# Altium integrated library AKN_PI_Library.IntLib: 35 symbols (part 2 of 2)

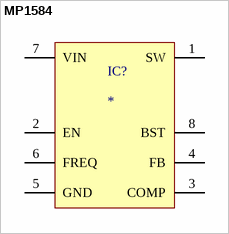
[diagram p23: symbol MP1584]

## MP1584
designator IC?
MP1584_3A, 1.5MHz, 28V_Step-Down Converter
footprint SOP8E
pins: 1 SW, 2 EN, 3 COMP, 4 FB, 5 GND, 6 FREQ, 7 VIN, 8 BST, 9 THERM hidden to GND


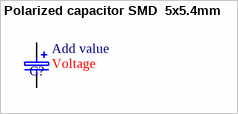
[diagram p24: symbol Polarized capacitor SMD  5x5.4mm]

## Polarized capacitor SMD  5x5.4mm
designator C?  value Add value  (hidden comment: Polarized capacitor SMD  5x5.4mm)
Electrolytic Capacitor SMD 5x5.4mm; Voltage: Voltage
footprint CAP_EL5x5.4mm
pins: 1, 2


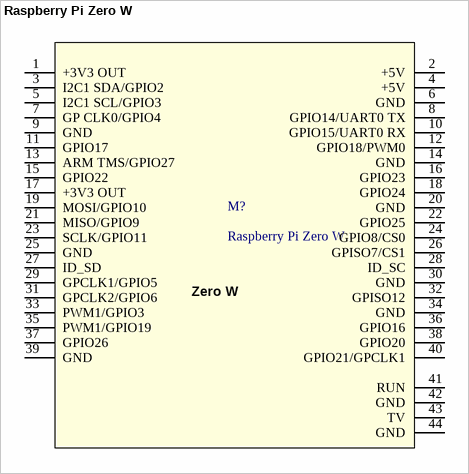
[diagram p25: symbol Raspberry Pi Zero W]

## Raspberry Pi Zero W
designator M?
Raspberry Pi Zero W module
footprint RPi-zero
pins: 1 +3V3 OUT, 2 +5V, 3 I2C1 SDA/GPIO2, 4 +5V, 5 I2C1 SCL/GPIO3, 6 GND, 7 GP CLK0/GPIO4, 8 GPIO14/UART0 TX, 9 GND, 10 GPIO15/UART0 RX, 11 GPIO17, 12 GPIO18/PWM0, 13 ARM TMS/GPIO27, 14 GND, 15 GPIO22, 16 GPIO23, 17 +3V3 OUT, 18 GPIO24, 19 MOSI/GPIO10, 20 GND, 21 MISO/GPIO9, 22 GPIO25, 23 SCLK/GPIO11, 24 GPIO8/CS0, 25 GND, 26 GPISO7/CS1, 27 ID_SD, 28 ID_SC, 29 GPCLK1/GPIO5, 30 GND, 31 GPCLK2/GPIO6, 32 GPISO12, 33 PWM1/GPIO3, 34 GND, 35 PWM1/GPIO19, 36 GPIO16, 37 GPIO26, 38 GPIO20, 39 GND, 40 GPIO21/GPCLK1, 41 RUN, 42 GND, 43 TV, 44 GND, 45 M hidden to GND, 46 M hidden to GND, 47 M hidden to GND, 48 M hidden to GND
text: Zero W


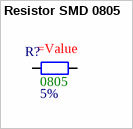
[diagram p26: symbol Resistor SMD 0805]

## Resistor SMD 0805
designator R?  Tolerance: 5%  Package: 0805
Resistor SMD 0805; Value: =Value
footprint R_0805
pins: 1, 2


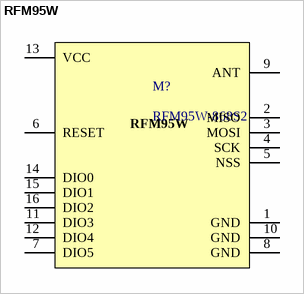
[diagram p27: symbol RFM95W]

## RFM95W
designator M?, comment RFM95W-868S2
HOPE MICROELECTRONICS RFM95W-868S2 - LoRa RF Module
footprint RFM95W-868S2
pins: 1 GND, 2 MISO, 3 MOSI, 4 SCK, 5 NSS, 6 RESET, 7 DIO5, 8 GND, 9 ANT, 10 GND, 11 DIO3, 12 DIO4, 13 VCC, 14 DIO0, 15 DIO1, 16 DIO2


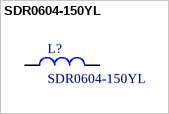
[diagram p28: symbol SDR0604-150YL]

## SDR0604-150YL
designator L?
SDR0604-150YL - SMD Power Inductors
footprint SDR0604-150YL
pins: 1, 2


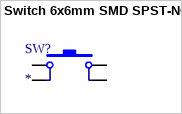
[diagram p29: symbol Switch 6x6mm SMD SPST-NO]

## Switch 6x6mm SMD SPST-NO
designator SW?
SCHURTER 1301.9315 - 6x6 mm tact switches
footprint Tact_SWITCH 6x6mm
pins: 1, 2, 3, 4


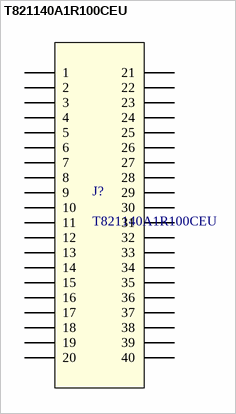
[diagram p30: symbol T821140A1R100CEU]

## T821140A1R100CEU
designator J?
T821140A1R100CEU; IDC 40-Pin Male Connector, Right angle
footprint T821140A1R100CEU
pins: 1, 2, 3, 4, 5, 6, 7, 8, 9, 10, 11, 12, 13, 14, 15, 16, 17, 18, 19, 20, 21, 22, 23, 24, 25, 26, 27, 28, 29, 30, 31, 32, 33, 34, 35, 36, 37, 38, 39, 40


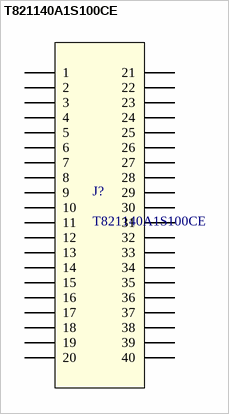
[diagram p31: symbol T821140A1S100CE]

## T821140A1S100CE
designator J?
T821140A1S100CE; IDC 40-Pin Male Connector, Straight
footprint T821140A1R100CEU
pins: 1, 2, 3, 4, 5, 6, 7, 8, 9, 10, 11, 12, 13, 14, 15, 16, 17, 18, 19, 20, 21, 22, 23, 24, 25, 26, 27, 28, 29, 30, 31, 32, 33, 34, 35, 36, 37, 38, 39, 40


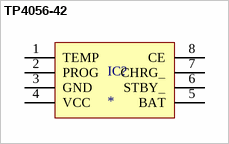
[diagram p32: symbol TP4056-42]

## TP4056-42
designator IC?
TP4056-42_Standalone Linear Li-ion battery charger
footprint SOP8
pins: 1 TEMP, 2 PROG, 3 GND, 4 VCC, 5 BAT, 6 STBY_, 7 CHRG_, 8 CE


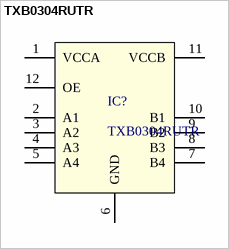
[diagram p33: symbol TXB0304RUTR]

## TXB0304RUTR
designator IC?
TXB0304RUTR 4-Bit Bidirectional Level-Shifter/Voltage Translator with Automatic Direction  Sensing
footprint UQFN_WSON12
pins: 1 VCCA, 2 A1, 3 A2, 4 A3, 5 A4, 6 GND, 7 B4, 8 B3, 9 B2, 10 B1, 11 VCCB, 12 OE


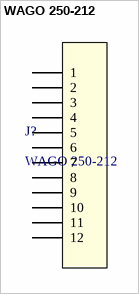
[diagram p34: symbol WAGO 250-212]

## WAGO 250-212
designator J?
WAGO 250-212, PCB terminal block; Push-button; 1.5 mm²; Pin spacing 3.5 mm; 12-pole;
footprint WAGO_250-212
pins: 1, 2, 3, 4, 5, 6, 7, 8, 9, 10, 11, 12